# Altium footprint library Resistors.PcbLib: 63 footprints (part 4 of 4)
Each footprint in its own frame and in the unit in brackets; x right, y up, seen from the top. Pads: shape width x height; smd on the part's side, far side on the other; paste and mask are expansions set on the pad; w line width, h text height; cw(c..) or ccw(c..) is an arc to the next point about the centre after c.
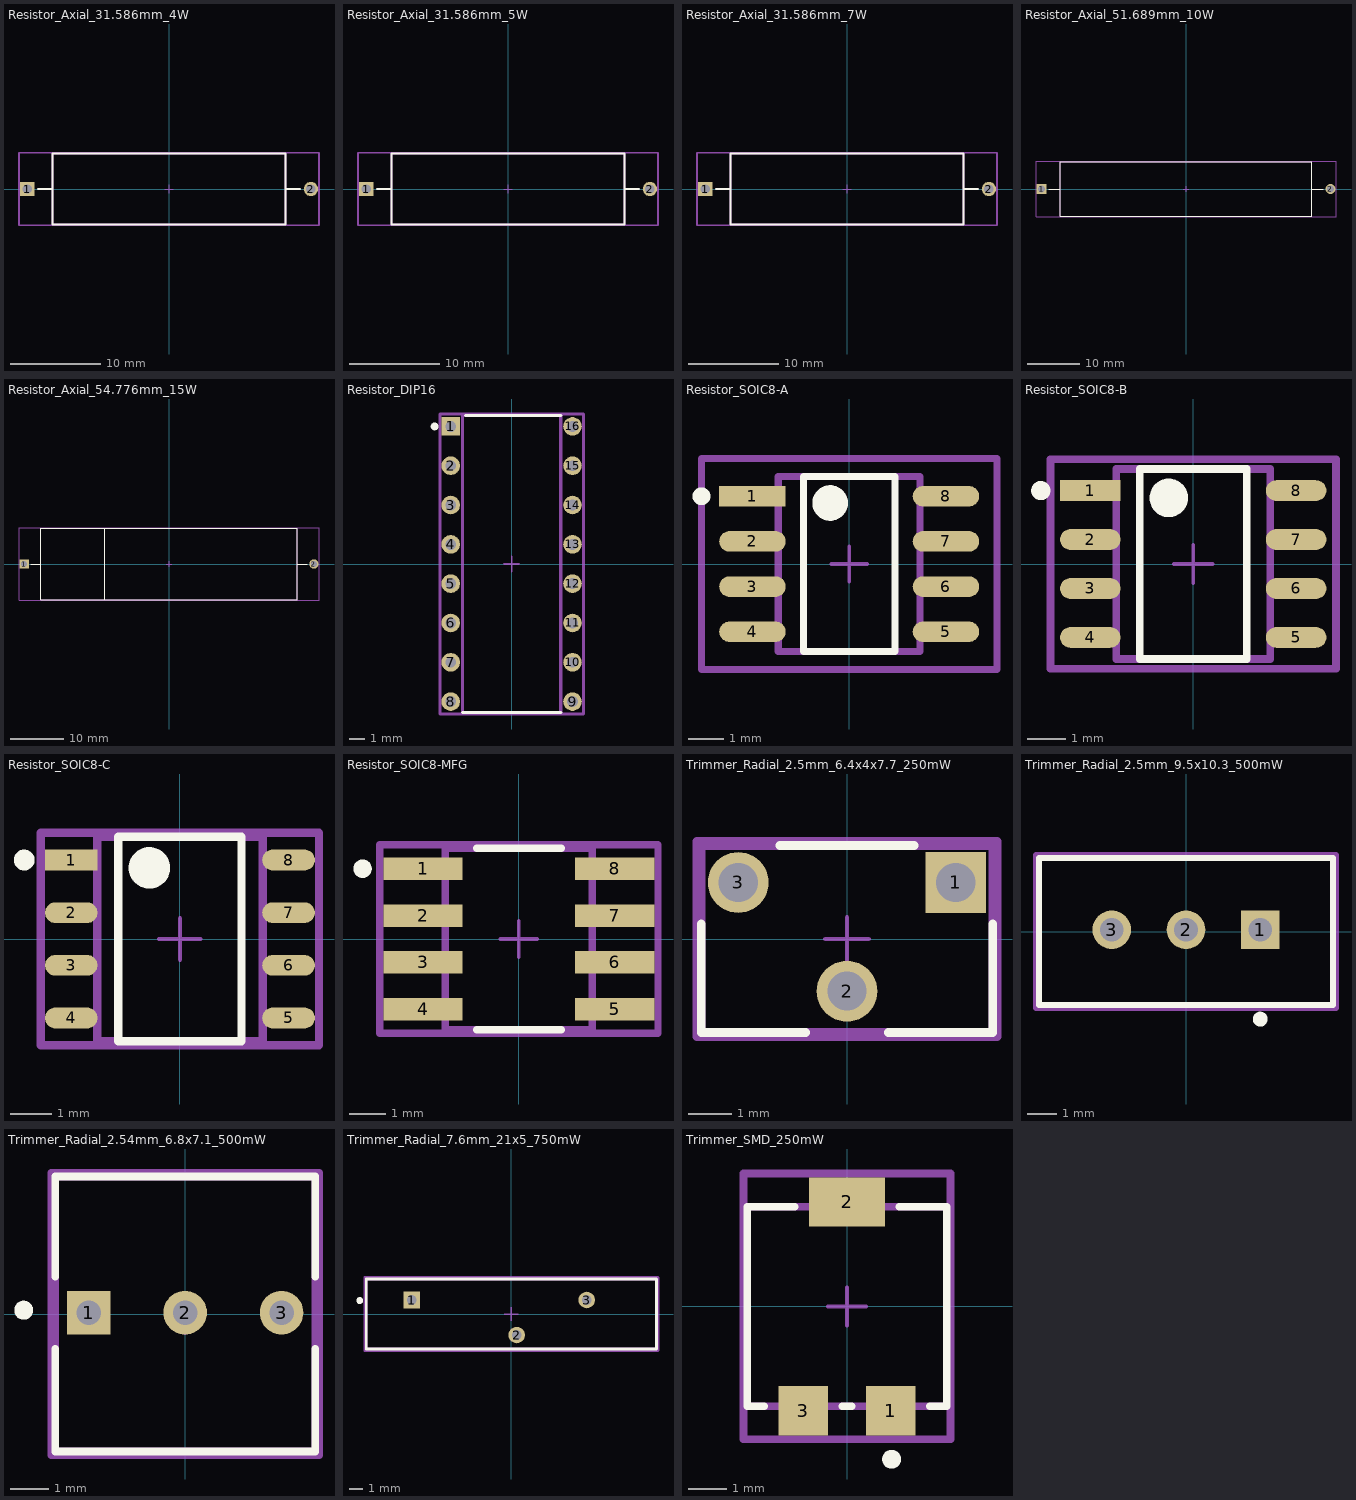
[diagram p3: the footprints below, top view; thin cyan lines are the x and y axes]

## Resistor_Axial_31.586mm_4W [mm]
pads (2):
  rect 1.6x1.6 hole 1.05 paste-2539.97 mask+0: 1(-15.793,0)
  round 1.6 hole 1.05 paste-2539.97 mask+0: 2(15.793,0)
Top Overlay:
  lines w0.2: -14.593,0 -12.955,0 ; 12.955,0 14.593,0 ; -12.955,-3.935 -12.955,3.935 12.955,3.935 12.955,-3.935 -12.955,-3.935
Top Assembly:
  lines w0.2: -16.693,-4.035 -16.693,4.035 16.693,4.035 16.693,-4.035 -16.693,-4.035
Top 3D Body:
  lines w0.2: -12.955,-3.935 -12.955,3.935 12.955,3.935 12.955,-3.935 -12.955,-3.935
Top Courtyard:
  lines w0.2: -16.693,-4.035 -16.693,4.035 16.693,4.035 16.693,-4.035 -16.693,-4.035
Top Component Center:
  lines w0.1: -0.5,0 0.5,0 ; 0,-0.5 0,0.5
3D body "Res_Vishay_ROX1001K00FKLB_eec.STEP": height 0.25, standoff 0, extent -16.693,-4.035 16.693,4.035

## Resistor_Axial_31.586mm_5W [mm]
pads (2):
  rect 1.6x1.6 hole 1.05 paste-2539.97 mask+0: 1(-15.793,0)
  round 1.6 hole 1.05 paste-2539.97 mask+0: 2(15.793,0)
Top Overlay:
  lines w0.2: -14.593,0 -12.955,0 ; 12.955,0 14.593,0 ; -12.955,-3.935 -12.955,3.935 12.955,3.935 12.955,-3.935 -12.955,-3.935
Top Assembly:
  lines w0.2: -16.693,-4.035 -16.693,4.035 16.693,4.035 16.693,-4.035 -16.693,-4.035
Top 3D Body:
  lines w0.2: -12.955,-3.935 -12.955,3.935 12.955,3.935 12.955,-3.935 -12.955,-3.935
Top Courtyard:
  lines w0.2: -16.693,-4.035 -16.693,4.035 16.693,4.035 16.693,-4.035 -16.693,-4.035
Top Component Center:
  lines w0.1: -0.5,0 0.5,0 ; 0,-0.5 0,0.5
3D body "Res_Vishay_ROX1001K00FKLB_eec.STEP": height 0.25, standoff 0, extent -16.693,-4.035 16.693,4.035

## Resistor_Axial_31.586mm_7W [mm]
pads (2):
  rect 1.6x1.6 hole 1.05 paste-2539.97 mask+0: 1(-15.793,0)
  round 1.6 hole 1.05 paste-2539.97 mask+0: 2(15.793,0)
Top Overlay:
  lines w0.2: -14.593,0 -12.955,0 ; 12.955,0 14.593,0 ; -12.955,-3.935 12.955,-3.935 12.955,3.935 -12.955,3.935 -12.955,-3.935
Top Assembly:
  lines w0.2: -16.693,-4.035 16.693,-4.035 16.693,4.035 -16.693,4.035 -16.693,-4.035
Top 3D Body:
  lines w0.2: -12.955,-3.935 12.955,-3.935 12.955,3.935 -12.955,3.935 -12.955,-3.935
Top Courtyard:
  lines w0.2: -16.693,-4.035 16.693,-4.035 16.693,4.035 -16.693,4.035 -16.693,-4.035
Top Component Center:
  lines w0.1: -0.5,0 0.5,0 ; 0,-0.5 0,0.5
3D body "Res_Vishay_ROX1001K00FKLB_eec.STEP": height 0.25, standoff 0, extent -16.693,-4.035 16.693,4.035

## Resistor_Axial_51.689mm_10W [mm]
pads (2):
  rect 1.9x1.9 hole 1.25 paste-2539.97 mask+0: 1(-27.344,0)
  round 1.9 hole 1.25 paste-2539.97 mask+0: 2(27.344,0)
Top Overlay:
  lines w0.2: -25.994,0 -23.81,0 ; 23.81,0 25.994,0 ; -23.81,-5.166 23.81,-5.166 23.81,5.166 -23.81,5.166 -23.81,-5.166
Top Assembly:
  lines w0.2: -28.394,-5.266 28.394,-5.266 28.394,5.266 -28.394,5.266 -28.394,-5.266
Top 3D Body:
  lines w0.2: -23.81,-5.166 23.81,-5.166 23.81,5.166 -23.81,5.166 -23.81,-5.166
Top Courtyard:
  lines w0.2: -28.394,-5.266 28.394,-5.266 28.394,5.266 -28.394,5.266 -28.394,-5.266
Top Component Center:
  lines w0.1: -0.5,0 0.5,0 ; 0,-0.5 0,0.5
3D body "Res_Vishay_Dale_CW01010R00JS73_eec.STEP": height 0.25, standoff 0, extent -28.394,-5.266 28.394,5.266

## Resistor_Axial_54.776mm_15W [mm]
pads (2):
  rect 1.75x1.75 hole 1.15 paste-2539.97 mask+0: 1(-27.388,0)
  round 1.75 hole 1.15 paste-2539.97 mask+0: 2(27.388,0)
Top Overlay:
  lines w0.2: -26.113,0 -24.207,0 ; -12.103,-6.677 -12.103,6.677 ; 24.207,0 26.113,0 ; -24.207,-6.747 24.207,-6.747 24.207,6.747 -24.207,6.747 -24.207,-6.747
Top Assembly:
  lines w0.2: -28.363,-6.847 28.363,-6.847 28.363,6.847 -28.363,6.847 -28.363,-6.847
Top 3D Body:
  lines w0.2: -24.207,-6.747 24.207,-6.747 24.207,6.747 -24.207,6.747 -24.207,-6.747
Top Courtyard:
  lines w0.2: -28.363,-6.847 28.363,-6.847 28.363,6.847 -28.363,6.847 -28.363,-6.847
Top Component Center:
  lines w0.1: -0.5,0 0.5,0 ; 0,-0.5 0,0.5
3D body "Res_Vishay_CP001510R00JE14_eec.STEP": height 0.25, standoff 0, extent -28.363,-6.847 28.363,6.847

## Resistor_DIP16 [mm]
pads (16):
  rect 1.2x1.2 hole 0.7 paste-2539.97 mask+0: 1(-3.935,8.89)
  round 1.2 hole 0.7 paste-2539.97 mask+0: 2(-3.935,6.35) 3(-3.935,3.81) 4(-3.935,1.27) 5(-3.935,-1.27) 6(-3.935,-3.81) 7(-3.935,-6.35) 8(-3.935,-8.89) 9(3.935,-8.89) 10(3.935,-6.35) 11(3.935,-3.81) 12(3.935,-1.27) 13(3.935,1.27) 14(3.935,3.81) 15(3.935,6.35) 16(3.935,8.89)
Top Overlay:
  circle w0.25: c-4.975,8.89 r0.125
  lines w0.2: -3.175,-9.59 3.175,-9.59 ; -2.96,9.59 3.175,9.59
Top Assembly:
  lines w0.2: -4.635,-9.69 4.635,-9.69 4.635,9.69 -4.635,9.69 -4.635,-9.69
Top 3D Body:
  lines w0.2: -3.175,-9.59 3.175,-9.59 3.175,9.59 -3.175,9.59 -3.175,-9.59
Top Courtyard:
  lines w0.2: -4.635,-9.69 4.635,-9.69 4.635,9.69 -4.635,9.69 -4.635,-9.69
Top Component Center:
  lines w0.1: -0.5,0 0.5,0 ; 0,-0.5 0,0.5
3D body "Res_Vishay_TDP16031003DUF_eec.STEP": height 0.25, standoff 0, extent -4.635,-9.69 4.635,9.69

## Resistor_SOIC8-A [mm]
pads (8):
  rect 1.869x0.579 smd paste+0 mask+0: 1(-2.72,1.905)
  rrect100% 1.869x0.579 smd paste+0 mask+0: 2(-2.72,0.635) 3(-2.72,-0.635) 4(-2.72,-1.905) 5(2.72,-1.905) 6(2.72,-0.635) 7(2.72,0.635) 8(2.72,1.905)
Top Overlay:
  circle w0.25: c-4.155,1.905 r0.125
  circle w0.5: c-0.535,1.715 r0.25
  lines w0.2: -1.285,-2.465 -1.285,2.465 1.285,2.465 1.285,-2.465 -1.285,-2.465
Top Assembly:
  lines w0.2: -4.155,-2.965 -4.155,2.965 4.155,2.965 4.155,-2.965 -4.155,-2.965
Top 3D Body:
  lines w0.2: -1.995,-2.465 -1.995,2.465 1.995,2.465 1.995,-2.465 -1.995,-2.465
Top Courtyard:
  lines w0.2: -4.155,-2.965 -4.155,2.965 4.155,2.965 4.155,-2.965 -4.155,-2.965
Top Component Center:
  lines w0.1: -0.5,0 0.5,0 ; 0,-0.5 0,0.5
3D body "Res_Vishay_ORNTA1002AT1_eec.STEP": height 0.25, standoff 0, extent -4.155,-2.965 4.155,2.965

## Resistor_SOIC8-B [mm]
pads (8):
  rect 1.569x0.539 smd paste+0 mask+0: 1(-2.67,1.905)
  rrect100% 1.569x0.539 smd paste+0 mask+0: 2(-2.67,0.635) 3(-2.67,-0.635) 4(-2.67,-1.905) 5(2.67,-1.905) 6(2.67,-0.635) 7(2.67,0.635) 8(2.67,1.905)
Top Overlay:
  circle w0.5: c-0.635,1.715 r0.25
  circle w0.25: c-3.955,1.905 r0.125
  lines w0.2: -1.385,-2.465 1.385,-2.465 1.385,2.465 -1.385,2.465 -1.385,-2.465
Top Assembly:
  lines w0.2: -3.705,-2.715 3.705,-2.715 3.705,2.715 -3.705,2.715 -3.705,-2.715
Top 3D Body:
  lines w0.2: -1.995,-2.465 1.995,-2.465 1.995,2.465 -1.995,2.465 -1.995,-2.465
Top Courtyard:
  lines w0.2: -3.705,-2.715 3.705,-2.715 3.705,2.715 -3.705,2.715 -3.705,-2.715
Top Component Center:
  lines w0.1: -0.5,0 0.5,0 ; 0,-0.5 0,0.5
3D body "Res_Vishay_ORNTA1002AT1_eec.STEP": height 0.25, standoff 0, extent -3.705,-2.715 3.705,2.715

## Resistor_SOIC8-C [mm]
pads (8):
  rect 1.269x0.499 smd paste+0 mask+0: 1(-2.62,1.905)
  rrect100% 1.269x0.499 smd paste+0 mask+0: 2(-2.62,0.635) 3(-2.62,-0.635) 4(-2.62,-1.905) 5(2.62,-1.905) 6(2.62,-0.635) 7(2.62,0.635) 8(2.62,1.905)
Top Overlay:
  circle w0.5: c-0.735,1.715 r0.25
  circle w0.25: c-3.755,1.905 r0.125
  lines w0.2: -1.485,-2.465 1.485,-2.465 1.485,2.465 -1.485,2.465 -1.485,-2.465
Top Assembly:
  lines w0.2: -3.355,-2.565 3.355,-2.565 3.355,2.565 -3.355,2.565 -3.355,-2.565
Top 3D Body:
  lines w0.2: -1.995,-2.465 1.995,-2.465 1.995,2.465 -1.995,2.465 -1.995,-2.465
Top Courtyard:
  lines w0.2: -3.355,-2.565 3.355,-2.565 3.355,2.565 -3.355,2.565 -3.355,-2.565
Top Component Center:
  lines w0.1: -0.5,0 0.5,0 ; 0,-0.5 0,0.5
3D body "Res_Vishay_ORNTA1002AT1_eec.STEP": height 0.25, standoff 0, extent -3.355,-2.565 3.355,2.565

## Resistor_SOIC8-MFG [mil]
pads (8):
  rect 85x24.02 smd paste+0 mask+0: 1(-102.5,75) 2(-102.5,25) 3(-102.5,-25) 4(-102.5,-75) 5(102.5,-75) 6(102.5,-25) 7(102.5,25) 8(102.5,75)
Top Overlay:
  circle w9.84: c-167.13,75.2 r4.92
  lines w7.87: -45.24,-97.05 45.24,-97.05 ; -45.24,97.05 45.24,97.05
Top Assembly:
  lines w7.87: -148.94,-100.98 148.94,-100.98 148.94,100.98 -148.94,100.98 -148.94,-100.98
Top 3D Body:
  lines w7.87: -78.54,-97.05 78.54,-97.05 78.54,97.05 -78.54,97.05 -78.54,-97.05
Top Courtyard:
  lines w7.87: -148.94,-100.98 148.94,-100.98 148.94,100.98 -148.94,100.98 -148.94,-100.98
Top Component Center:
  lines w3.94: -19.68,0 19.68,0 ; 0,-19.68 0,19.68
3D body "Res_Vishay_ORNTA1002AT1_eec.STEP": height 10, standoff 0, extent -148.94,-100.98 148.94,100.98

## Trimmer_Radial_2.5mm_6.4x4x7.7_250mW [mm]
pads (3):
  rect 1.4x1.4 hole 0.9 paste-2539.97 mask+0: 1(2.5,1.3)
  round 1.4 hole 0.9 paste-2539.97 mask+0: 2(0,-1.2) 3(-2.5,1.3)
Top Overlay:
  lines w0.2: -3.35,0.35 -3.35,-2.15 -0.95,-2.15 ; -1.55,2.15 1.55,2.15 ; 0.95,-2.15 3.35,-2.15 3.35,0.35
Top Assembly:
  lines w0.2: -3.45,-2.25 -3.45,2.25 3.45,2.25 3.45,-2.25 -3.45,-2.25
Top 3D Body:
  lines w0.2: -3.35,-2.15 -3.35,2.15 3.35,2.15 3.35,-2.15 -3.35,-2.15
Top Courtyard:
  lines w0.2: -3.45,-2.25 -3.45,2.25 3.45,2.25 3.45,-2.25 -3.45,-2.25
Top Component Center:
  lines w0.1: -0.5,0 0.5,0 ; 0,-0.5 0,0.5
3D body "Res_Murata_PV37W101C01B00_eec.STEP": height 0.25, standoff 0, extent -3.45,-2.25 3.45,2.25

## Trimmer_Radial_2.5mm_9.5x10.3_500mW [mm]
pads (3):
  rect 1.3x1.3 hole 0.8 paste-2539.97 mask+0: 1(2.5,0.065)
  round 1.3 hole 0.8 paste-2539.97 mask+0: 2(0,0.065) 3(-2.5,0.065)
Top Overlay:
  circle w0.25: c2.5,-2.95 r0.125
  lines w0.2: -4.955,-2.475 4.955,-2.475 4.955,2.475 -4.955,2.475 -4.955,-2.475
Top Assembly:
  lines w0.2: -5.055,-2.575 5.055,-2.575 5.055,2.575 -5.055,2.575 -5.055,-2.575
Top 3D Body:
  lines w0.2: -4.955,-2.475 4.955,-2.475 4.955,2.475 -4.955,2.475 -4.955,-2.475
Top Courtyard:
  lines w0.2: -5.055,-2.575 5.055,-2.575 5.055,2.575 -5.055,2.575 -5.055,-2.575
Top Component Center:
  lines w0.1: -0.5,0 0.5,0 ; 0,-0.5 0,0.5
3D body "Res_BI_Technologies_67WR100KLF_eec.STEP": height 0.25, standoff 0, extent -5.055,-2.575 5.055,2.575

## Trimmer_Radial_2.54mm_6.8x7.1_500mW [mm]
pads (3):
  rect 1.15x1.15 hole 0.65 paste-2539.97 mask+0: 1(-2.54,0.035)
  round 1.15 hole 0.65 paste-2539.97 mask+0: 2(0,0.035) 3(2.54,0.035)
Top Overlay:
  circle w0.25: c-4.25,0.1 r0.125
  lines w0.2: -3.425,-0.915 -3.425,-3.62 3.425,-3.62 3.425,-0.915 ; -3.425,0.985 -3.425,3.62 3.425,3.62 3.425,0.985
Top Assembly:
  lines w0.2: -3.525,-3.72 3.525,-3.72 3.525,3.72 -3.525,3.72 -3.525,-3.72
Top 3D Body:
  lines w0.2: -3.425,-3.62 3.425,-3.62 3.425,3.62 -3.425,3.62 -3.425,-3.62
Top Courtyard:
  lines w0.2: -3.525,-3.72 3.525,-3.72 3.525,3.72 -3.525,3.72 -3.525,-3.72
Top Component Center:
  lines w0.1: -0.5,0 0.5,0 ; 0,-0.5 0,0.5
3D body "Res_Bourns_3362U-1-204LF_eec.STEP": height 0.25, standoff 0, extent -3.525,-3.72 3.525,3.72

## Trimmer_Radial_7.6mm_21x5_750mW [mm]
pads (3):
  rect 1.2x1.2 hole 0.7 paste-2539.97 mask+0: 1(-7.235,1.015)
  round 1.2 hole 0.7 paste-2539.97 mask+0: 2(0.385,-1.525) 3(5.465,1.015)
Top Overlay:
  circle w0.25: c-11,0.975 r0.125
  lines w0.2: -10.535,-2.54 -10.535,2.54 10.535,2.54 10.535,-2.54 -10.535,-2.54
Top Assembly:
  lines w0.2: -10.635,-2.64 -10.635,2.64 10.635,2.64 10.635,-2.64 -10.635,-2.64
Top 3D Body:
  lines w0.2: -10.535,-2.54 -10.535,2.54 10.535,2.54 10.535,-2.54 -10.535,-2.54
Top Courtyard:
  lines w0.2: -10.635,-2.64 -10.635,2.64 10.635,2.64 10.635,-2.64 -10.635,-2.64
Top Component Center:
  lines w0.1: -0.5,0 0.5,0 ; 0,-0.5 0,0.5
3D body "Res_Bourns_3006P-1-103LF_eec.STEP": height 0.25, standoff 0, extent -10.635,-2.64 10.635,2.64

## Trimmer_SMD_250mW [mm]
pads (3):
  rect 1.3x1.3 smd paste+0 mask+0: 1(1.15,-2.75) 3(-1.15,-2.75)
  rect 2x1.3 smd paste+0 mask+0: 2(0,2.75)
Top Overlay:
  circle w0.25: c1.175,-4.025 r0.125
  lines w0.2: -2.175,-2.625 -2.625,-2.625 -2.625,2.625 -1.375,2.625 ; -0.125,-2.625 0.125,-2.625 ; 1.375,2.625 2.625,2.625 2.625,-2.625 2.175,-2.625
Top Assembly:
  lines w0.2: -2.725,-3.5 2.725,-3.5 2.725,3.5 -2.725,3.5 -2.725,-3.5
Top 3D Body:
  lines w0.2: -2.625,-2.625 2.625,-2.625 2.625,2.625 -2.625,2.625 -2.625,-2.625
Top Courtyard:
  lines w0.2: -2.725,-3.5 2.725,-3.5 2.725,3.5 -2.725,3.5 -2.725,-3.5
Top Component Center:
  lines w0.1: -0.5,0 0.5,0 ; 0,-0.5 0,0.5
3D body "Res_Vishay_TS53YL103MR10_eec.STEP": height 0.25, standoff 0, extent -2.725,-3.5 2.725,3.5